# Altium footprint library Hydrolib_pcb.PcbLib: 101 footprints (part 2 of 7)
Each footprint in its own frame and in the unit in brackets; x right, y up, seen from the top. Pads: shape width x height; smd on the part's side, far side on the other; paste and mask are expansions set on the pad; w line width, h text height; cw(c..) or ccw(c..) is an arc to the next point about the centre after c.
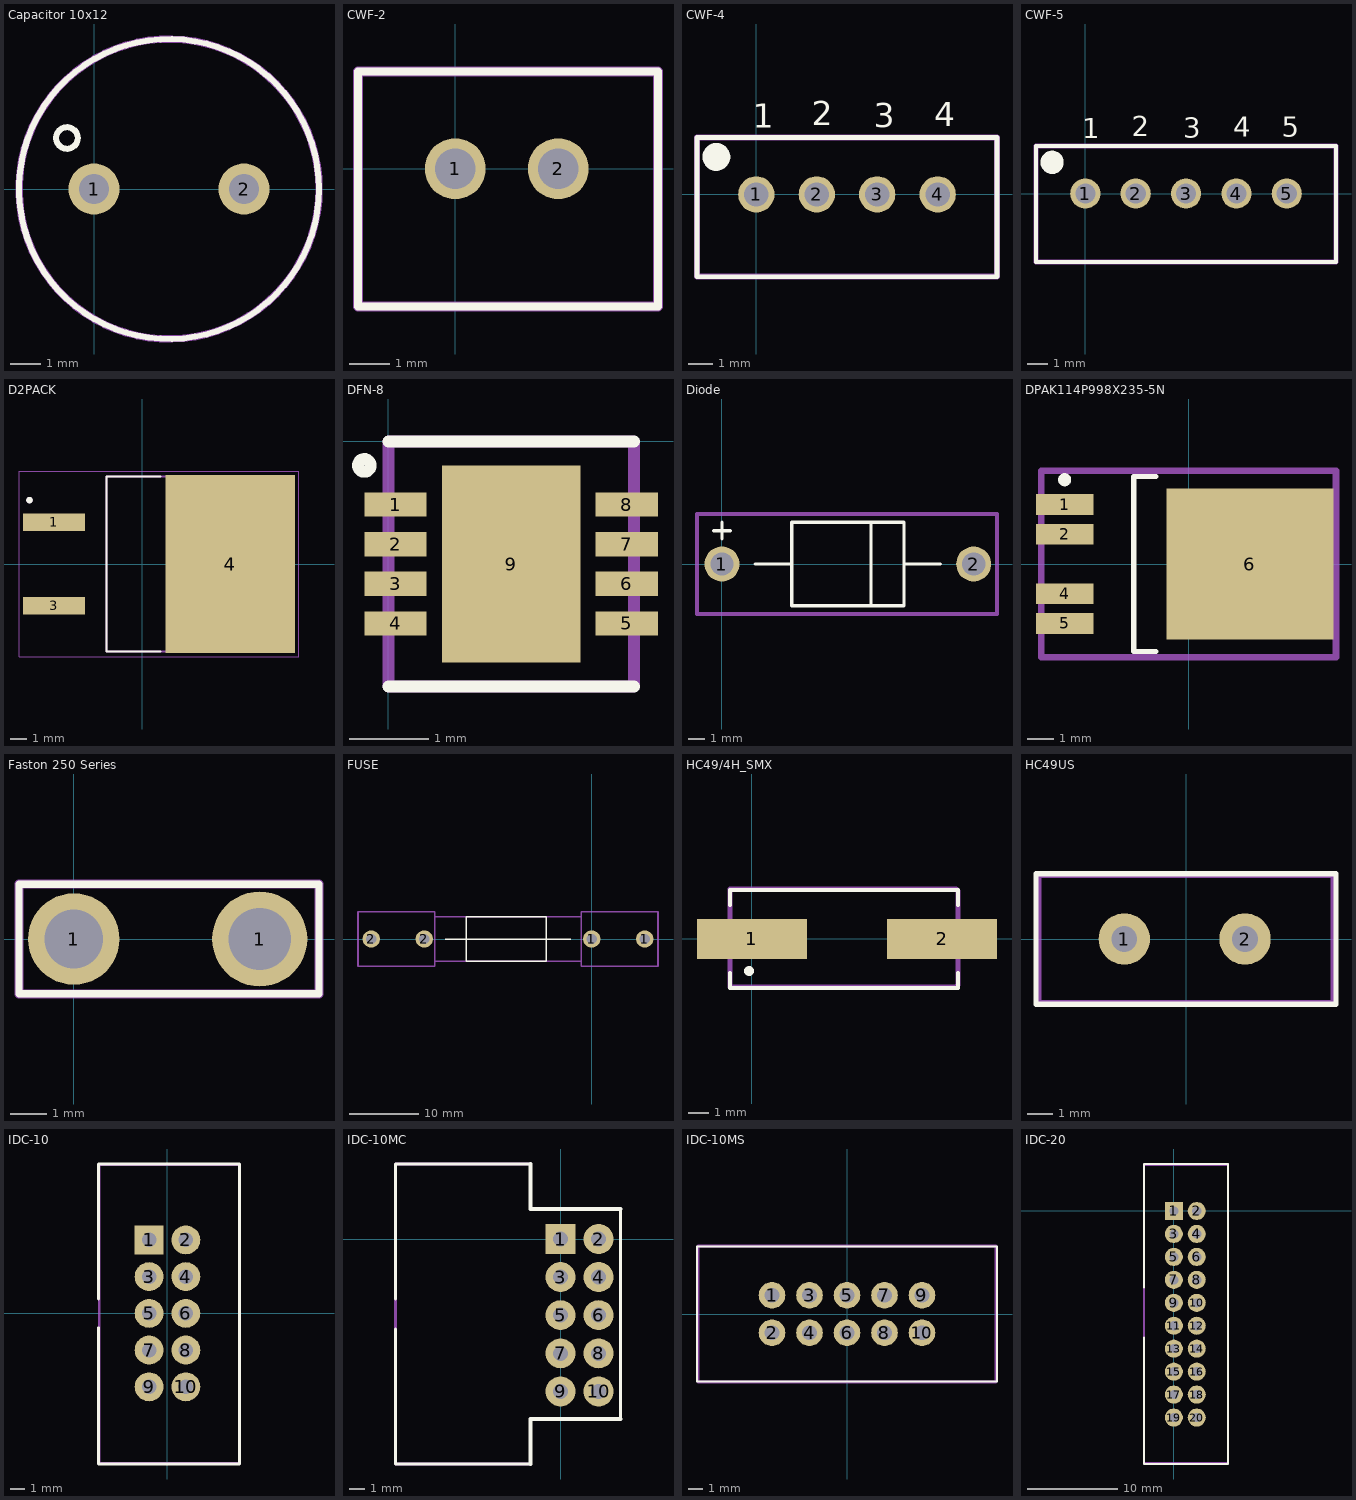
[diagram p1: the footprints below, top view; thin cyan lines are the x and y axes]

## Capacitor 10x12 [mm]
pads (2):
  round 1.7 hole 1: 1(0,0) 2(5,0)
Top Overlay:
  circle w0.2: c2.5,0 r5
  circle w0.2: c-0.9,1.7 r0.361
Pattern top:
  circle w0.25: c2.5,0 r5
  text ".Designator" at -1.5,-0.4 h2.15
3D body "Kondensator_10kh12.step": height 12.5, standoff -18.5, extent -2.5,-5 7.5,5

## CWF-2 [mm] "перемычка для плат"
pads (2):
  round 1.5 hole 1: 1(0,0) 2(2.54,0)
Top Overlay:
  lines w0.2: -2.4,-3.4 5,-3.4 5,2.4 -2.4,2.4 -2.4,-3.4
Pattern top:
  lines w0.25: -2.4,-3.4 5,-3.4 5,2.4 -2.4,2.4 -2.4,-3.4
  text ".Designator" at -1.7,-2.3 h2.15
3D body "cwf-2.STEP": height 7, standoff -3.4, extent -2.4,-3.375 5,2.375

## CWF-4 [mm]
pads (4):
  round 1.5 hole 1: 1(0,0) 2(2.5,0) 3(5,0) 4(7.5,0)
Top Overlay:
  circle w0.75: c-1.65,1.55 r0.2
  lines w0.2: -2.45,-3.4 -2.45,2.35 9.95,2.35 9.95,0 9.95,-3.4 -2.45,-3.4
  text "1" at -0.15,2.75 h1
  text "2" at 2.3,2.85 h1
  text "3" at 4.85,2.775 h1
  text "4" at 7.35,2.825 h1
Top Solder:
  lines w0.1: 6.35,-0.75 6.375,-0.75 6.875,-1.25 8,-1.25 8.187,-1.062 8.563,-0.687 ; 6.375,0.775 6.875,1.275 8.1,1.275 8.75,0.625 8.75,-0.5 8.563,-0.687 ; 8.563,-0.687 8.563,-0.687
Pattern top:
  lines w0.25: -2.45,-3.4 9.95,-3.4 9.95,0 9.95,2.35 -2.45,2.35 -2.45,-3.4
  text ".Designator" at 0,-2.4 h2.15
3D body "cwf-4.STEP": height 7, standoff -3.4, extent -2.4,-3.475 10,2.275

## CWF-5 [mm]
pads (5):
  round 1.5 hole 1: 1(0,0) 2(2.5,0) 3(5,0) 4(7.5,0) 5(10,0)
Top Overlay:
  circle w0.75: c-1.65,1.55 r0.2
  lines w0.2: -2.45,-3.4 -2.45,2.35 9.95,2.35 12.446,2.35 12.446,-3.4 -2.45,-3.4
  text "1" at -0.15,2.75 h1
  text "2" at 2.3,2.85 h1
  text "3" at 4.85,2.775 h1
  text "4" at 7.35,2.825 h1
  text "5" at 9.754,2.819 h1
Pattern top:
  lines w0.25: -2.45,-3.4 12.446,-3.4 12.446,2.35 9.95,2.35 -2.45,2.35 -2.45,-3.4
  text ".Designator" at 0.7,-2 h2.15
3D body "cwf-5.STEP": height 7, standoff -2.35, extent -2.55,-3.375 12.35,2.375

## D2PACK [mm]
pads (3):
  rect 3.78x1.06 smd: 1(-5.375,2.54) 3(-5.375,-2.54)
  rect 7.88x10.84 smd paste-6: 4(5.375,0)
Top Overlay:
  circle w0.2: c-6.875,3.9 r0.1
  lines w0.127: 1.122,-5.34 -2.183,-5.34 -2.183,5.34 1.122,5.34
Top Paste:
  region: 8.165,-3.83 2.585,-3.83 2.585,3.83 8.165,3.83
Pattern top:
  text ".Designator" at -0.95,6 h1.52
Mechanical 13:
  circle w0.2: c-6.875,3.9 r0.1
  lines w0.127: -2.183,-5.34 -2.183,5.34 7.478,5.34 7.478,-5.34 -2.183,-5.34
Mechanical 15:
  lines w0.05: -7.515,-5.67 9.565,-5.67 9.565,5.67 -7.515,5.67 -7.515,-5.67
3D body "IRF4905STRRPBF--3DModel-STEP-56544.STEP": height 4.83, standoff -0.25, extent -6.498,-5.08 8.742,5.08

## DFN-8 [mil]
pads (9):
  rect 31x12 smd: 1(3.5,-31.47) 2(3.5,-51.16) 3(3.5,-70.84) 4(3.5,-90.53) 5(118.5,-90.53) 6(118.5,-70.84) 7(118.5,-51.16) 8(118.5,-31.47)
  rect 69x98 smd paste-78.74: 9(61,-61)
Top Overlay:
  lines w5.91: -8.92,-11.35 ccw(c-12,-12) -8.85,-12
  lines w6: 0,-122 122,-122 ; 0,0 122,0
Top Paste:
  region: 95.5,-110 26.5,-110 26.5,-12 95.5,-12
Pattern top:
  lines w6: 0,-122 0,0 ; 122,-122 122,0
  text ".Designator" at -18.7,26.57 h84.65
Mechanical 13:
  lines w6: 0,-122 122,-122 ; 0,0 49,0 73,0 122,0
3D body "step_temp.STEP": height 31.5, standoff -1.97, extent 21.63,-120.05 100.37,-1.94

## Diode [mm]
pads (2):
  round 2.1 hole 1.4: 1(0,0) 2(15.1,0)
Top Overlay:
  lines w0.2: -0.5,2 0.5,2 ; 0,1.5 0,2.5 ; 2,0 4.175,0 ; 8.942,-2.5 8.942,2.5 ; 10.925,0 13.1,0 ; 4.175,0 4.175,-2.5 10.925,-2.5 10.925,2.5 4.175,2.5 4.175,0
Pattern top:
  lines w0.25: -1.5,-3 16.5,-3 16.5,3 -1.5,3 -1.5,0 -1.5,-3
  text ".Designator" at 3,4 h2.15
3D body: height 9.8, standoff 0, extent 8.942,-2.499 10.924,2.499
3D body: height 9.8, standoff 0, extent 4.176,-2.499 8.941,2.499

## DPAK114P998X235-5N [mm] "D-PAK, 5-Pads, Body 6,21x6,69mm (max), IPC Medium Density"
height 2.35
pads (5):
  rect 2.2x0.8 smd: 1(-4.75,2.28) 2(-4.75,1.14) 4(-4.75,-1.14) 5(-4.75,-2.28)
  rect 6.4x5.8 smd: 6(2.35,0)
Top Overlay:
  circle w0.25: c-4.75,3.23 r0.125
  lines w0.2: -1.25,-3.35 -2.1,-3.35 -2.1,3.35 -1.25,3.35
Pattern top:
  lines w0.1: -0.5,0 0.5,0 ; 0,-0.5 0,0.5
  lines w0.25: -5.65,-3.575 -5.65,3.575 5.65,3.575 5.65,-3.575 -5.65,-3.575
3D body "DPAK114P998X235-5N.step": height 2.5, standoff 0, extent -4.61,-3.325 5.37,3.325

## Faston 250 Series [mm]
pads (2):
  round 2.5 hole 1.6: 1(0,0)
  round 2.6 hole 1.7: 1(5.08,0)
Top Overlay:
  lines w0.2: -1.5,-1.5 6.7,-1.5 6.7,1.5 -1.5,1.5 -1.5,-1.5
Pattern top:
  lines w0.25: -1.5,-1.5 -1.5,1.5 6.7,1.5 6.7,-1.5 -1.5,-1.5
  text ".Designator" at -1.525,2.925 h2.15
3D body "c-62650.sldprt": height 9.21, standoff -3.18, extent -0.975,-0.415 6.125,0.415

## FUSE [mm]
pads (4):
  round 2.5 hole 1.5: 1(0,0) 1(7.6,0) 2(-31.6,0) 2(-24,0)
Top Overlay:
  lines w0.2: -21,0 -3,0 ; -18,-3.2 -6.5,-3.2 -6.5,0 -6.5,3.2 -18,3.2 -18,0 -18,-3.2
Template:
  text ".Designator" at -17.2,3.9 h2.15
Pattern top:
  lines w0.25: -22.5,-3.2 -18,-3.2 -1.5,-3.2 ; -22.5,3.2 -6.5,3.2 -1.5,3.2 ; -33.5,-3.9 -22.5,-3.9 -22.5,0 -22.5,3.9 -33.5,3.9 -33.5,0 -33.5,-3.9 ; -1.5,-3.9 9.5,-3.9 9.5,0 9.5,3.9 -1.5,3.9 -1.5,0 -1.5,-3.9
3D body "fuse.STEP": height 12.03, standoff -2.93, extent -32.327,-4.2 8.327,4.15

## HC49/4H_SMX [mm] "Surface Mount Quartz Crystal; Body 13.4 (inc. leads) x 4.9 mm (LxW max)"
height 4.3
pads (2):
  rect 5.5x2 smd: 1(0,0) 2(9.5,0)
Top Overlay:
  circle w0.25: c-0.15,-1.6 r0.125
  lines w0.2: -1.1,-1.7 -1.1,-2.45 10.3,-2.45 10.3,-1.7 ; -1.1,1.7 -1.1,2.45 10.3,2.45 10.3,1.7
Pattern top:
  lines w0.25: -1.1,-2.4 -1.1,2.5 10.2,2.5 10.3,2.4 10.3,-2.3 10.2,-2.4 -1.1,-2.4
  text ".Designator" at 4.5,7.503 h1.52
3D body "HC-49SM.stp": height 4, standoff 0, extent -2.2,-2.4 11.2,2.4

## HC49US [mm]
pads (2):
  round 2 hole 1: 1(-2.4,0) 2(2.3,0)
Top Overlay:
  lines w0.2: -5.842,-2.54 -5.842,2.54 5.842,2.54 5.842,-2.54 -5.842,-2.54
Pattern top:
  text ".Designator" at -4.1,3.5 h2.15
Pattern bot:
  lines w0.25: 5,-2.5 -5,-2.5 ; -5,-2.5 -5.75,-2.5 -5.75,2.5 -5,2.5 5,2.5 5.75,2.5 5.75,-2.5 -5,-2.5
3D body "XTAL-HP49US.STEP": height 3.5, standoff -3, extent -5.675,-2.25 5.675,2.4

## IDC-10 [mm] "IDC-10 Male Connector"
height 9
pads (10):
  rect 2x2 hole 1: 1(-1.25,5.075)
  round 2 hole 1: 2(1.29,5.075) 3(-1.25,2.535) 4(1.29,2.535) 5(-1.25,-0.005) 6(1.29,-0.005) 7(-1.25,-2.545) 8(1.29,-2.545) 9(-1.25,-5.085) 10(1.29,-5.085)
Top Overlay:
  lines w0.2: -4.75,-1 -4.75,-10.425 5,-10.425 5,10.325 -4.75,10.325 -4.75,1
Pattern top:
  lines w0.2: -4.7,-10.4 -4.7,10.3 5,10.3 5,-10.4 -4.7,-10.4
  text ".Designator" at -4.3,7.4 h2.15
3D body "User Library-BH-10__64BH-10.STEP": height 9.1, standoff -3, extent -4.53,-10.305 4.77,10.195

## IDC-10MC [mm] "IDC-14 Male Connector"
height 9
pads (10):
  rect 2x2 hole 1: 1(0,0)
  round 2 hole 1: 2(2.54,0) 3(0,-2.54) 4(2.54,-2.54) 5(0,-5.08) 6(2.54,-5.08) 7(0,-7.62) 8(2.54,-7.62) 9(0,-10.16) 10(2.54,-10.16)
Top Layer:
  lines w0.254: -0.254,0 0.254,0 ; 0,-0.254 0,0.254
Top Overlay:
  lines w0.2: -11,-6 -11,-15 -2,-15 ; -11,-4 -11,5 -2,5 ; 4,-12 4,2
  lines w0.254: -2,-15 -2,-12 4,-12 ; -2,5 -2,2 4,2
Template:
  lines w0.2: -11,-15 -2,-15 ; -11,5 -2,5
Pattern top:
  lines w0.2: -11,-15 -2,-15 -2,-12 4,-12 4,2 -2,2 -2,5 -10.9,5 -11,4.9 -11,-15
  text ".Designator" at -11,2.6 h2.15
3D body "IDC Male 10pin Angled 2_54mm.STEP": height 8.98, standoff -2.37, extent -10.735,-15.57 2.825,5.37

## IDC-10MS [mm]
pads (10):
  round 1.8 hole 1: 1(-5.08,1.27) 2(-5.08,-1.27) 3(-2.54,1.27) 4(-2.54,-1.27) 5(0,1.27) 6(0,-1.27) 7(2.54,1.27) 8(2.54,-1.27) 9(5.08,1.27) 10(5.08,-1.27)
Top Overlay:
  lines w0.15: -10.16,-4.572 -10.16,4.572 10.16,4.572 10.16,-4.572 -10.16,-4.572
Pattern top:
  lines w0.2: -10.1,-4.6 -10.1,4.6 10.1,4.6 10.1,-4.6 -10.1,-4.6
  text ".Designator" at -4.7,2.8 h2.15
3D body "User Library-BH-10__64BH-10.STEP": height 9.1, standoff -3, extent -10.25,-4.75 10.25,4.55

## IDC-20 [mm] "IDC-20 Male Connector"
height 9
pads (20):
  rect 2x2 hole 1: 1(0,0)
  round 2 hole 1: 2(2.54,0) 3(0,-2.54) 4(2.54,-2.54) 5(0,-5.08) 6(2.54,-5.08) 7(0,-7.62) 8(2.54,-7.62) 9(0,-10.16) 10(2.54,-10.16) 11(0,-12.7) 12(2.54,-12.7) 13(0,-15.24) 14(2.54,-15.24) 15(0,-17.78) 16(2.54,-17.78) 17(0,-20.32) 18(2.54,-20.32) 19(0,-22.86) 20(2.54,-22.86)
Top Overlay:
  lines w0.2: -3.3,-14 -3.3,-28 6,-28 6,5.2 -3.3,5.2 -3.3,-8.5
Pattern top:
  lines w0.2: -3.3,-27.9 6,-27.9 6,5.2 5.9,5.1 -3.3,5.1 -3.3,-27.9
  text ".Designator" at -3.2,2.3 h2.15
3D body "User Library-BH-10__64BH-20.STEP": height 9.1, standoff -3, extent -3.3,-28 6,5.2